# Altium footprint library Molex FFC - FPC Connectors (SMT).PcbLib: 638 footprints (part 2 of 40)
Each footprint in its own frame and in the unit in brackets; x right, y up, seen from the top. Pads: shape width x height; smd on the part's side, far side on the other; paste and mask are expansions set on the pad; w line width, h text height; cw(c..) or ccw(c..) is an arc to the next point about the centre after c.
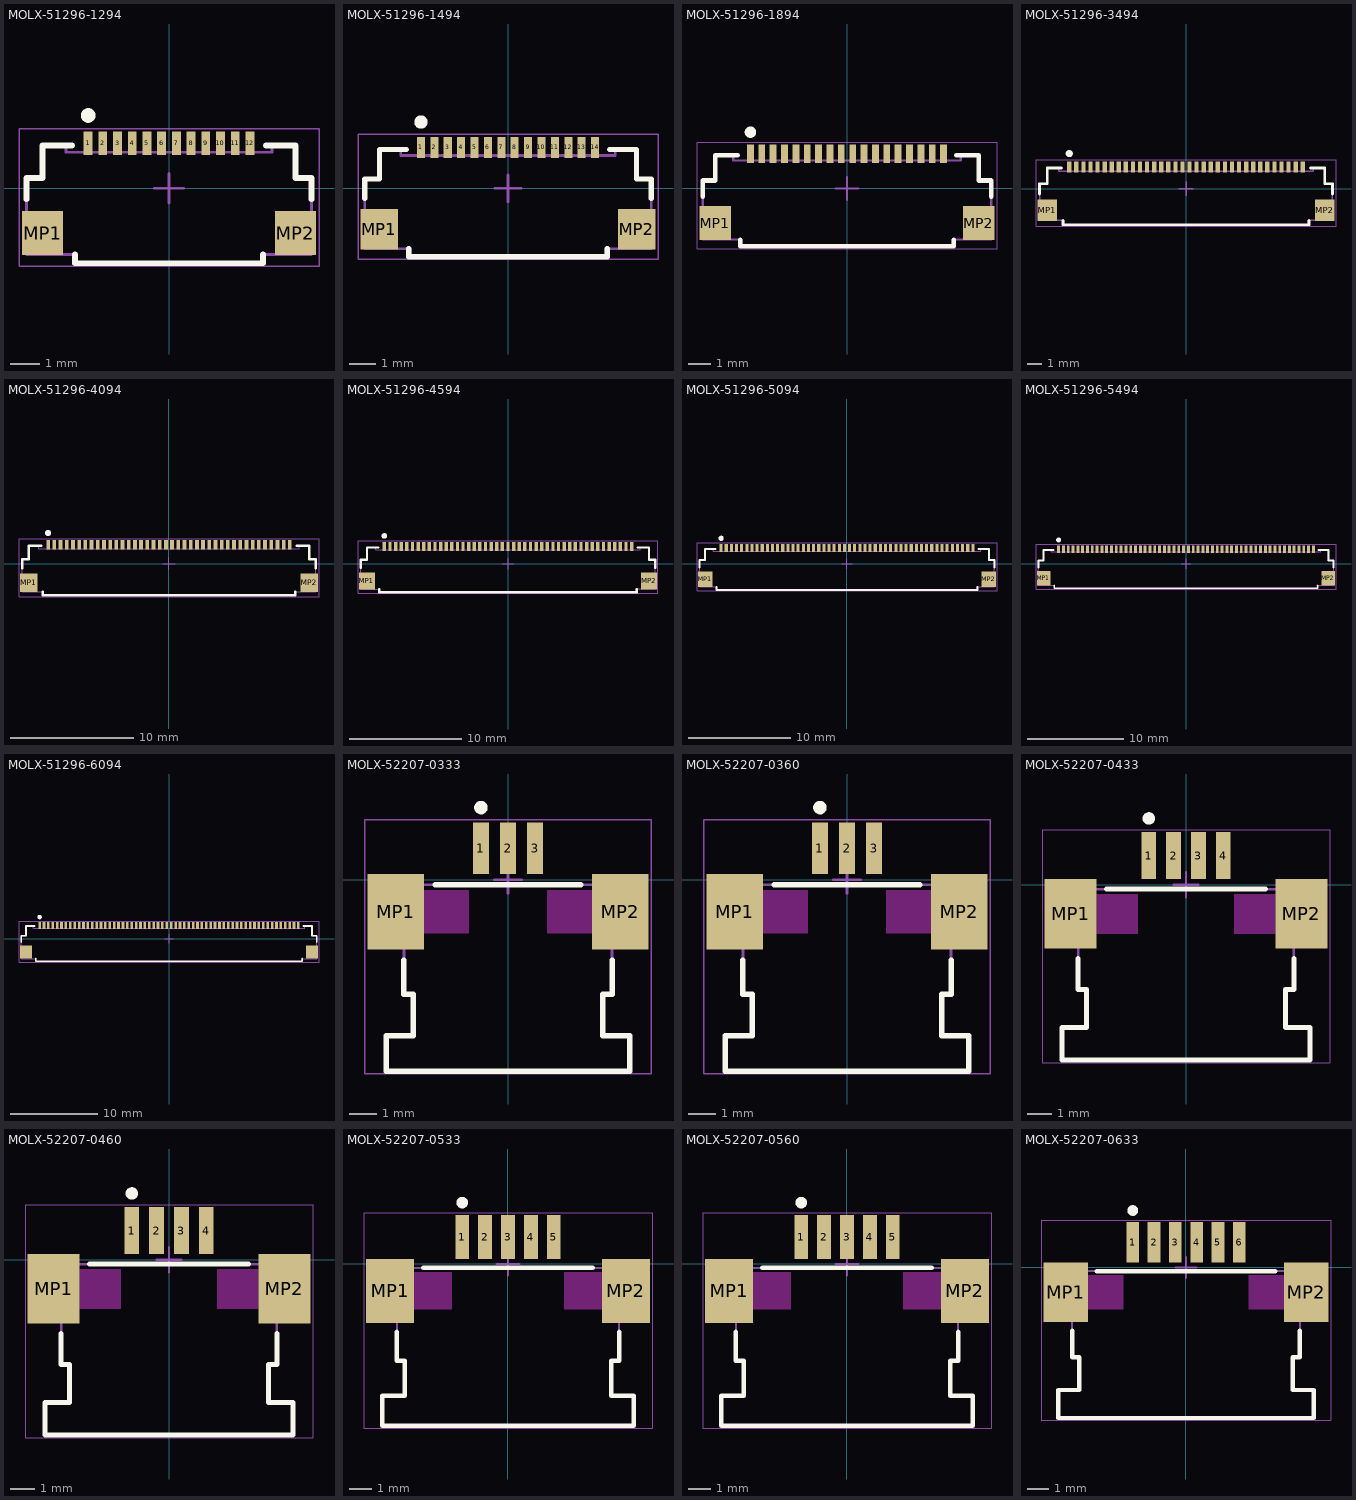
[diagram p1: the footprints below, top view; thin cyan lines are the x and y axes]

## MOLX-51296-1294 [mm] "FPC Connector, 12-Leads, Right Angle, Pitch 0.5 mm, Mated Height 1.3 mm, SMT"
height 1.312
pads (14):
  rect 0.3x0.8 smd: 1(-2.75,1.525) 2(-2.25,1.525) 3(-1.75,1.525) 4(-1.25,1.525) 5(-0.75,1.525) 6(-0.25,1.525) 7(0.25,1.525) 8(0.75,1.525) 9(1.25,1.525) 10(1.75,1.525) 11(2.25,1.525) 12(2.75,1.525)
  rect 1.4x1.5 smd: MP1(-4.3,-1.525) MP2(4.3,-1.525)
Top Overlay:
  circle w0.25: c-2.75,2.475 r0.125
  lines w0.2: -4.85,-0.375 -4.85,0.35 -4.3,0.35 -4.3,1.45 -3.3,1.45 ; -3.2,-2.25 -3.2,-2.55 3.2,-2.55 3.2,-2.25 ; 3.3,1.45 4.3,1.45 4.3,0.35 4.85,0.35 4.85,-0.375
Mechanical 13:
  lines w0.1: -4.85,-2.25 -4.85,0.35 -4.3,0.35 -4.3,1.45 -3.5,1.45 -3.5,1.225 3.5,1.225 3.5,1.45 4.3,1.45 4.3,0.35 4.85,0.35 4.85,-2.25 3.15,-2.25 3.15,-2.55 -3.15,-2.55 -3.15,-2.25 -4.85,-2.25
Mechanical 15:
  lines w0.05: -5.1,-2.65 -5.1,2.025 5.1,2.025 5.1,-2.65 -5.1,-2.65
  lines w0.1: -0.5,0 0.5,0 ; 0,-0.5 0,0.5
3D body: height 0.25, standoff 0, extent -4.85,-2.549 4.85,1.75

## MOLX-51296-1494 [mm] "FPC Connector, 14-Leads, Right Angle, Pitch 0.5 mm, Mated Height 1.3 mm, SMT"
height 1.312
pads (16):
  rect 0.3x0.8 smd: 1(-3.25,1.525) 2(-2.75,1.525) 3(-2.25,1.525) 4(-1.75,1.525) 5(-1.25,1.525) 6(-0.75,1.525) 7(-0.25,1.525) 8(0.25,1.525) 9(0.75,1.525) 10(1.25,1.525) 11(1.75,1.525) 12(2.25,1.525) 13(2.75,1.525) 14(3.25,1.525)
  rect 1.4x1.5 smd: MP1(-4.8,-1.525) MP2(4.8,-1.525)
Top Overlay:
  circle w0.25: c-3.25,2.475 r0.125
  lines w0.2: -5.35,-0.375 -5.35,0.35 -4.8,0.35 -4.8,1.45 -3.8,1.45 ; -3.7,-2.25 -3.7,-2.55 3.7,-2.55 3.7,-2.25 ; 3.8,1.45 4.8,1.45 4.8,0.35 5.35,0.35 5.35,-0.375
Mechanical 13:
  lines w0.1: -5.35,-2.25 -3.65,-2.25 -3.65,-2.55 3.65,-2.55 3.65,-2.25 5.35,-2.25 5.35,0.35 4.8,0.35 4.8,1.45 4,1.45 4,1.225 -4,1.225 -4,1.45 -4.8,1.45 -4.8,0.35 -5.35,0.35 -5.35,-2.25
Mechanical 15:
  lines w0.05: -5.6,-2.65 5.6,-2.65 5.6,2.025 -5.6,2.025 -5.6,-2.65
  lines w0.1: -0.5,0 0.5,0 ; 0,-0.5 0,0.5
3D body: height 0.25, standoff 0, extent -5.35,-2.55 5.35,1.75

## MOLX-51296-1894 [mm] "FPC Connector, 18-Leads, Right Angle, Pitch 0.5 mm, Mated Height 1.3 mm, SMT"
height 1.312
pads (20):
  rect 0.3x0.8 smd: 1(-4.25,1.525) 2(-3.75,1.525) 3(-3.25,1.525) 4(-2.75,1.525) 5(-2.25,1.525) 6(-1.75,1.525) 7(-1.25,1.525) 8(-0.75,1.525) 9(-0.25,1.525) 10(0.25,1.525) 11(0.75,1.525) 12(1.25,1.525) 13(1.75,1.525) 14(2.25,1.525) 15(2.75,1.525) 16(3.25,1.525) 17(3.75,1.525) 18(4.25,1.525)
  rect 1.4x1.5 smd: MP1(-5.8,-1.525) MP2(5.8,-1.525)
Top Overlay:
  circle w0.25: c-4.25,2.475 r0.125
  lines w0.2: -6.35,-0.375 -6.35,0.35 -5.8,0.35 -5.8,1.45 -4.8,1.45 ; -4.7,-2.25 -4.7,-2.55 4.7,-2.55 4.7,-2.25 ; 4.8,1.45 5.8,1.45 5.8,0.35 6.35,0.35 6.35,-0.375
Mechanical 13:
  lines w0.1: -6.35,-2.25 -4.65,-2.25 -4.65,-2.55 4.65,-2.55 4.65,-2.25 6.35,-2.25 6.35,0.35 5.8,0.35 5.8,1.45 5,1.45 5,1.225 -5,1.225 -5,1.45 -5.8,1.45 -5.8,0.35 -6.35,0.35 -6.35,-2.25
Mechanical 15:
  lines w0.05: -6.6,-2.65 6.6,-2.65 6.6,2.025 -6.6,2.025 -6.6,-2.65
  lines w0.1: -0.5,0 0.5,0 ; 0,-0.5 0,0.5
3D body: height 0.25, standoff 0, extent -6.35,-2.549 6.35,1.75

## MOLX-51296-3494 [mm] "FPC Connector, 34-Leads, Right Angle, Pitch 0.5 mm, Mated Height 1.3 mm, SMT"
height 1.312
pads (36):
  rect 0.3x0.8 smd: 1(-8.25,1.525) 2(-7.75,1.525) 3(-7.25,1.525) 4(-6.75,1.525) 5(-6.25,1.525) 6(-5.75,1.525) 7(-5.25,1.525) 8(-4.75,1.525) 9(-4.25,1.525) 10(-3.75,1.525) 11(-3.25,1.525) 12(-2.75,1.525) 13(-2.25,1.525) 14(-1.75,1.525) 15(-1.25,1.525) 16(-0.75,1.525) 17(-0.25,1.525) 18(0.25,1.525) 19(0.75,1.525) 20(1.25,1.525) 21(1.75,1.525) 22(2.25,1.525) 23(2.75,1.525) 24(3.25,1.525) 25(3.75,1.525) 26(4.25,1.525) 27(4.75,1.525) 28(5.25,1.525) 29(5.75,1.525) 30(6.25,1.525) 31(6.75,1.525) 32(7.25,1.525) 33(7.75,1.525) 34(8.25,1.525)
  rect 1.4x1.5 smd: MP1(-9.8,-1.525) MP2(9.8,-1.525)
Top Overlay:
  circle w0.25: c-8.25,2.475 r0.125
  lines w0.2: -10.35,-0.375 -10.35,0.35 -9.8,0.35 -9.8,1.45 -8.8,1.45 ; -8.7,-2.25 -8.7,-2.55 8.7,-2.55 8.7,-2.25 ; 8.8,1.45 9.8,1.45 9.8,0.35 10.35,0.35 10.35,-0.375
Mechanical 13:
  lines w0.1: -10.35,-2.25 -10.35,0.35 -9.8,0.35 -9.8,1.45 -9,1.45 -9,1.225 9,1.225 9,1.45 9.8,1.45 9.8,0.35 10.35,0.35 10.35,-2.25 8.65,-2.25 8.65,-2.55 -8.65,-2.55 -8.65,-2.25 -10.35,-2.25
Mechanical 15:
  lines w0.05: -10.6,-2.65 -10.6,2.025 10.6,2.025 10.6,-2.65 -10.6,-2.65
  lines w0.1: -0.5,0 0.5,0 ; 0,-0.5 0,0.5
3D body: height 0.25, standoff 0, extent -10.35,-2.549 10.35,1.75

## MOLX-51296-4094 [mm] "FPC Connector, 40-Leads, Right Angle, Pitch 0.5 mm, Mated Height 1.3 mm, SMT"
height 1.312
pads (42):
  rect 0.3x0.8 smd: 1(-9.75,1.525) 2(-9.25,1.525) 3(-8.75,1.525) 4(-8.25,1.525) 5(-7.75,1.525) 6(-7.25,1.525) 7(-6.75,1.525) 8(-6.25,1.525) 9(-5.75,1.525) 10(-5.25,1.525) 11(-4.75,1.525) 12(-4.25,1.525) 13(-3.75,1.525) 14(-3.25,1.525) 15(-2.75,1.525) 16(-2.25,1.525) 17(-1.75,1.525) 18(-1.25,1.525) 19(-0.75,1.525) 20(-0.25,1.525) 21(0.25,1.525) 22(0.75,1.525) 23(1.25,1.525) 24(1.75,1.525) 25(2.25,1.525) 26(2.75,1.525) 27(3.25,1.525) 28(3.75,1.525) 29(4.25,1.525) 30(4.75,1.525) 31(5.25,1.525) 32(5.75,1.525) 33(6.25,1.525) 34(6.75,1.525) 35(7.25,1.525) 36(7.75,1.525) 37(8.25,1.525) 38(8.75,1.525) 39(9.25,1.525) 40(9.75,1.525)
  rect 1.4x1.5 smd: MP1(-11.3,-1.525) MP2(11.3,-1.525)
Top Overlay:
  circle w0.25: c-9.75,2.475 r0.125
  lines w0.2: -11.85,-0.375 -11.85,0.35 -11.3,0.35 -11.3,1.45 -10.3,1.45 ; -10.2,-2.25 -10.2,-2.55 10.2,-2.55 10.2,-2.25 ; 10.3,1.45 11.3,1.45 11.3,0.35 11.85,0.35 11.85,-0.375
Mechanical 13:
  lines w0.1: -11.85,-2.25 -11.85,0.35 -11.3,0.35 -11.3,1.45 -10.5,1.45 -10.5,1.225 10.5,1.225 10.5,1.45 11.3,1.45 11.3,0.35 11.85,0.35 11.85,-2.25 10.15,-2.25 10.15,-2.55 -10.15,-2.55 -10.15,-2.25 -11.85,-2.25
Mechanical 15:
  lines w0.05: -12.1,-2.65 -12.1,2.025 12.1,2.025 12.1,-2.65 -12.1,-2.65
  lines w0.1: -0.5,0 0.5,0 ; 0,-0.5 0,0.5
3D body: height 0.25, standoff 0, extent -11.85,-2.549 11.85,1.75

## MOLX-51296-4594 [mm] "FPC Connector, 45-Leads, Right Angle, Pitch 0.5 mm, Mated Height 1.3 mm, SMT"
height 1.312
pads (47):
  rect 0.3x0.8 smd: 1(-11,1.525) 2(-10.5,1.525) 3(-10,1.525) 4(-9.5,1.525) 5(-9,1.525) 6(-8.5,1.525) 7(-8,1.525) 8(-7.5,1.525) 9(-7,1.525) 10(-6.5,1.525) 11(-6,1.525) 12(-5.5,1.525) 13(-5,1.525) 14(-4.5,1.525) 15(-4,1.525) 16(-3.5,1.525) 17(-3,1.525) 18(-2.5,1.525) 19(-2,1.525) 20(-1.5,1.525) 21(-1,1.525) 22(-0.5,1.525) 23(0,1.525) 24(0.5,1.525) 25(1,1.525) 26(1.5,1.525) 27(2,1.525) 28(2.5,1.525) 29(3,1.525) 30(3.5,1.525) 31(4,1.525) 32(4.5,1.525) 33(5,1.525) 34(5.5,1.525) 35(6,1.525) 36(6.5,1.525) 37(7,1.525) 38(7.5,1.525) 39(8,1.525) 40(8.5,1.525) 41(9,1.525) 42(9.5,1.525) 43(10,1.525) 44(10.5,1.525) 45(11,1.525)
  rect 1.4x1.5 smd: MP1(-12.55,-1.525) MP2(12.55,-1.525)
Top Overlay:
  circle w0.25: c-11,2.475 r0.125
  lines w0.2: -13.1,-0.375 -13.1,0.35 -12.55,0.35 -12.55,1.45 -11.55,1.45 ; -11.45,-2.25 -11.45,-2.55 11.45,-2.55 11.45,-2.25 ; 11.55,1.45 12.55,1.45 12.55,0.35 13.1,0.35 13.1,-0.375
Mechanical 13:
  lines w0.1: -13.1,-2.25 -11.4,-2.25 -11.4,-2.55 11.4,-2.55 11.4,-2.25 13.1,-2.25 13.1,0.35 12.55,0.35 12.55,1.45 11.75,1.45 11.75,1.225 -11.75,1.225 -11.75,1.45 -12.55,1.45 -12.55,0.35 -13.1,0.35 -13.1,-2.25
Mechanical 15:
  lines w0.05: -13.35,-2.65 13.35,-2.65 13.35,2.025 -13.35,2.025 -13.35,-2.65
  lines w0.1: -0.5,0 0.5,0 ; 0,-0.5 0,0.5
3D body: height 0.25, standoff 0, extent -13.1,-2.549 13.1,1.75

## MOLX-51296-5094 [mm] "FPC Connector, 50-Leads, Right Angle, Pitch 0.5 mm, Mated Height 1.3 mm, SMT"
height 1.312
pads (52):
  rect 0.3x0.8 smd: 1(-12.25,1.525) 2(-11.75,1.525) 3(-11.25,1.525) 4(-10.75,1.525) 5(-10.25,1.525) 6(-9.75,1.525) 7(-9.25,1.525) 8(-8.75,1.525) 9(-8.25,1.525) 10(-7.75,1.525) 11(-7.25,1.525) 12(-6.75,1.525) 13(-6.25,1.525) 14(-5.75,1.525) 15(-5.25,1.525) 16(-4.75,1.525) 17(-4.25,1.525) 18(-3.75,1.525) 19(-3.25,1.525) 20(-2.75,1.525) 21(-2.25,1.525) 22(-1.75,1.525) 23(-1.25,1.525) 24(-0.75,1.525) 25(-0.25,1.525) 26(0.25,1.525) 27(0.75,1.525) 28(1.25,1.525) 29(1.75,1.525) 30(2.25,1.525) 31(2.75,1.525) 32(3.25,1.525) 33(3.75,1.525) 34(4.25,1.525) 35(4.75,1.525) 36(5.25,1.525) 37(5.75,1.525) 38(6.25,1.525) 39(6.75,1.525) 40(7.25,1.525) 41(7.75,1.525) 42(8.25,1.525) 43(8.75,1.525) 44(9.25,1.525) 45(9.75,1.525) 46(10.25,1.525) 47(10.75,1.525) 48(11.25,1.525) 49(11.75,1.525) 50(12.25,1.525)
  rect 1.4x1.5 smd: MP1(-13.8,-1.525) MP2(13.8,-1.525)
Top Overlay:
  circle w0.25: c-12.25,2.475 r0.125
  lines w0.2: -14.35,-0.375 -14.35,0.35 -13.8,0.35 -13.8,1.45 -12.8,1.45 ; -12.7,-2.25 -12.7,-2.55 12.7,-2.55 12.7,-2.25 ; 12.8,1.45 13.8,1.45 13.8,0.35 14.35,0.35 14.35,-0.375
Mechanical 13:
  lines w0.1: -14.35,-2.25 -12.65,-2.25 -12.65,-2.55 12.65,-2.55 12.65,-2.25 14.35,-2.25 14.35,0.35 13.8,0.35 13.8,1.45 13,1.45 13,1.225 -13,1.225 -13,1.45 -13.8,1.45 -13.8,0.35 -14.35,0.35 -14.35,-2.25
Mechanical 15:
  lines w0.05: -14.6,-2.65 14.6,-2.65 14.6,2.025 -14.6,2.025 -14.6,-2.65
  lines w0.1: -0.5,0 0.5,0 ; 0,-0.5 0,0.5
3D body: height 0.25, standoff 0, extent -14.35,-2.549 14.35,1.75

## MOLX-51296-5494 [mm] "FPC Connector, 54-Leads, Right Angle, Pitch 0.5 mm, Mated Height 1.3 mm, SMT"
height 1.312
pads (56):
  rect 0.3x0.8 smd: 1(-13.25,1.525) 2(-12.75,1.525) 3(-12.25,1.525) 4(-11.75,1.525) 5(-11.25,1.525) 6(-10.75,1.525) 7(-10.25,1.525) 8(-9.75,1.525) 9(-9.25,1.525) 10(-8.75,1.525) 11(-8.25,1.525) 12(-7.75,1.525) 13(-7.25,1.525) 14(-6.75,1.525) 15(-6.25,1.525) 16(-5.75,1.525) 17(-5.25,1.525) 18(-4.75,1.525) 19(-4.25,1.525) 20(-3.75,1.525) 21(-3.25,1.525) 22(-2.75,1.525) 23(-2.25,1.525) 24(-1.75,1.525) 25(-1.25,1.525) 26(-0.75,1.525) 27(-0.25,1.525) 28(0.25,1.525) 29(0.75,1.525) 30(1.25,1.525) 31(1.75,1.525) 32(2.25,1.525) 33(2.75,1.525) 34(3.25,1.525) 35(3.75,1.525) 36(4.25,1.525) 37(4.75,1.525) 38(5.25,1.525) 39(5.75,1.525) 40(6.25,1.525) 41(6.75,1.525) 42(7.25,1.525) 43(7.75,1.525) 44(8.25,1.525) 45(8.75,1.525) 46(9.25,1.525) 47(9.75,1.525) 48(10.25,1.525) 49(10.75,1.525) 50(11.25,1.525) 51(11.75,1.525) 52(12.25,1.525) 53(12.75,1.525) 54(13.25,1.525)
  rect 1.4x1.5 smd: MP1(-14.8,-1.525) MP2(14.8,-1.525)
Top Overlay:
  circle w0.25: c-13.25,2.475 r0.125
  lines w0.2: -15.35,-0.375 -15.35,0.35 -14.8,0.35 -14.8,1.45 -13.8,1.45 ; -13.7,-2.25 -13.7,-2.55 13.7,-2.55 13.7,-2.25 ; 13.8,1.45 14.8,1.45 14.8,0.35 15.35,0.35 15.35,-0.375
Mechanical 13:
  lines w0.1: -15.35,-2.25 -15.35,0.35 -14.8,0.35 -14.8,1.45 -14,1.45 -14,1.225 14,1.225 14,1.45 14.8,1.45 14.8,0.35 15.35,0.35 15.35,-2.25 13.65,-2.25 13.65,-2.55 -13.65,-2.55 -13.65,-2.25 -15.35,-2.25
Mechanical 15:
  lines w0.05: -15.6,-2.65 -15.6,2.025 15.6,2.025 15.6,-2.65 -15.6,-2.65
  lines w0.1: -0.5,0 0.5,0 ; 0,-0.5 0,0.5
3D body: height 0.25, standoff 0, extent -15.35,-2.549 15.35,1.75

## MOLX-51296-6094 [mm] "FPC Connector, 60-Leads, Right Angle, Pitch 0.5 mm, Mated Height 1.3 mm, SMT"
height 1.312
pads (62):
  rect 0.3x0.8 smd: 1(-14.75,1.525) 2(-14.25,1.525) 3(-13.75,1.525) 4(-13.25,1.525) 5(-12.75,1.525) 6(-12.25,1.525) 7(-11.75,1.525) 8(-11.25,1.525) 9(-10.75,1.525) 10(-10.25,1.525) 11(-9.75,1.525) 12(-9.25,1.525) 13(-8.75,1.525) 14(-8.25,1.525) 15(-7.75,1.525) 16(-7.25,1.525) 17(-6.75,1.525) 18(-6.25,1.525) 19(-5.75,1.525) 20(-5.25,1.525) 21(-4.75,1.525) 22(-4.25,1.525) 23(-3.75,1.525) 24(-3.25,1.525) 25(-2.75,1.525) 26(-2.25,1.525) 27(-1.75,1.525) 28(-1.25,1.525) 29(-0.75,1.525) 30(-0.25,1.525) 31(0.25,1.525) 32(0.75,1.525) 33(1.25,1.525) 34(1.75,1.525) 35(2.25,1.525) 36(2.75,1.525) 37(3.25,1.525) 38(3.75,1.525) 39(4.25,1.525) 40(4.75,1.525) 41(5.25,1.525) 42(5.75,1.525) 43(6.25,1.525) 44(6.75,1.525) 45(7.25,1.525) 46(7.75,1.525) 47(8.25,1.525) 48(8.75,1.525) 49(9.25,1.525) 50(9.75,1.525) 51(10.25,1.525) 52(10.75,1.525) 53(11.25,1.525) 54(11.75,1.525) 55(12.25,1.525) 56(12.75,1.525) 57(13.25,1.525) 58(13.75,1.525) 59(14.25,1.525) 60(14.75,1.525)
  rect 1.4x1.5 smd: MP1(-16.3,-1.525) MP2(16.3,-1.525)
Top Overlay:
  circle w0.25: c-14.75,2.475 r0.125
  lines w0.2: -16.85,-0.375 -16.85,0.35 -16.3,0.35 -16.3,1.45 -15.3,1.45 ; -15.2,-2.25 -15.2,-2.55 15.2,-2.55 15.2,-2.25 ; 15.3,1.45 16.3,1.45 16.3,0.35 16.85,0.35 16.85,-0.375
Mechanical 13:
  lines w0.1: -16.85,-2.25 -15.15,-2.25 -15.15,-2.55 15.15,-2.55 15.15,-2.25 16.85,-2.25 16.85,0.35 16.3,0.35 16.3,1.45 15.5,1.45 15.5,1.225 -15.5,1.225 -15.5,1.45 -16.3,1.45 -16.3,0.35 -16.85,0.35 -16.85,-2.25
Mechanical 15:
  lines w0.05: -17.1,-2.65 17.1,-2.65 17.1,2.025 -17.1,2.025 -17.1,-2.65
  lines w0.1: -0.5,0 0.5,0 ; 0,-0.5 0,0.5
3D body: height 0.25, standoff 0, extent -16.85,-2.549 16.85,1.75

## MOLX-52207-0333 [mm] "FPC Connector, 3-Leads, Right Angle, Pitch 1.0 mm, Mated Height 2.7 mm, SMT"
height 2.712
pads (5):
  rect 0.6x1.9 smd: 1(-1,1.175) 2(0,1.175) 3(1,1.175)
  rect 2.1x2.8 smd: MP1(-4.15,-1.175) MP2(4.15,-1.175)
Top Overlay:
  circle w0.25: c-1,2.675 r0.125
  lines w0.2: -3.85,-2.975 -3.85,-4.225 ; -2.7,-0.175 2.7,-0.175 ; 3.85,-2.975 3.85,-4.225 ; -3.85,-4.225 -3.513,-4.225 ; -3.85,-4.225 -3.85,-4.225 ; -3.512,-4.225 -3.512,-5.765 -4.5,-5.765 -4.5,-7.075 4.5,-7.075 4.5,-5.765 3.512,-5.765 3.512,-4.225 ; -3.513,-4.225 -3.512,-4.225 ; 3.513,-4.225 3.85,-4.225 ; 3.512,-4.225 3.513,-4.225 ; 3.85,-4.225 3.85,-4.225
Keep-Out Layer:
  region: -3.1,-0.375 -1.45,-0.375 -1.45,-1.975 -3.1,-1.975
  region: 3.1,-0.375 1.45,-0.375 1.45,-1.975 3.1,-1.975
Mechanical 13:
  lines w0.1: -3.85,-2.175 -4.65,-2.175 -4.65,-0.175 4.65,-0.175 4.65,-2.175 3.85,-2.175 ; -3.85,-2.175 -3.85,-4.225 -3.512,-4.225 -3.512,-5.765 -4.5,-5.765 -4.5,-7.075 4.5,-7.075 4.5,-5.765 3.512,-5.765 3.512,-4.225 3.85,-4.225 3.85,-2.175
Mechanical 15:
  lines w0.05: -5.3,-7.175 -5.3,2.225 5.3,2.225 5.3,-7.175 -5.3,-7.175
  lines w0.1: -0.5,0 0.5,0 ; 0,-0.5 0,0.5
3D body: height 0.25, standoff 0, extent -4.65,-7.075 4.65,1.825

## MOLX-52207-0360 [mm] "FPC Connector, 3-Leads, Right Angle, Pitch 1.0 mm, Mated Height 2.7 mm, SMT"
height 2.712
pads (5):
  rect 0.6x1.9 smd: 1(-1,1.175) 2(0,1.175) 3(1,1.175)
  rect 2.1x2.8 smd: MP1(-4.15,-1.175) MP2(4.15,-1.175)
Top Overlay:
  circle w0.25: c-1,2.675 r0.125
  lines w0.2: -3.85,-2.975 -3.85,-4.225 -3.513,-4.225 -3.512,-5.765 -4.5,-5.765 -4.5,-7.075 4.5,-7.075 4.5,-5.765 3.512,-5.765 3.512,-4.225 3.85,-4.225 3.85,-2.975 ; -2.7,-0.175 2.7,-0.175
Keep-Out Layer:
  region: 3.1,-0.375 1.45,-0.375 1.45,-1.975 3.1,-1.975
  region: -3.1,-0.375 -1.45,-0.375 -1.45,-1.975 -3.1,-1.975
Mechanical 13:
  lines w0.1: -3.85,-2.175 -4.65,-2.175 -4.65,-0.175 4.65,-0.175 4.65,-2.175 3.85,-2.175 ; -3.85,-2.175 -3.85,-4.225 -3.512,-4.225 -3.512,-5.765 -4.5,-5.765 -4.5,-7.075 4.5,-7.075 4.5,-5.765 3.512,-5.765 3.512,-4.225 3.85,-4.225 3.85,-2.175
Mechanical 15:
  lines w0.05: -5.3,-7.175 5.3,-7.175 5.3,2.225 -5.3,2.225 -5.3,-7.175
  lines w0.1: -0.5,0 0.5,0 ; 0,-0.5 0,0.5
3D body: height 0.25, standoff 0, extent -4.65,-7.075 4.65,1.825

## MOLX-52207-0433 [mm] "FPC Connector, 4-Leads, Right Angle, Pitch 1.0 mm, Mated Height 2.7 mm, SMT"
height 2.712
pads (6):
  rect 0.6x1.9 smd: 1(-1.5,1.175) 2(-0.5,1.175) 3(0.5,1.175) 4(1.5,1.175)
  rect 2.1x2.8 smd: MP1(-4.65,-1.175) MP2(4.65,-1.175)
Top Overlay:
  circle w0.25: c-1.5,2.675 r0.125
  lines w0.2: -4.35,-2.975 -4.35,-4.225 ; -3.2,-0.175 3.2,-0.175 ; 4.35,-2.975 4.35,-4.225 ; -4.35,-4.225 -4.013,-4.225 -4.012,-4.225 -4.012,-5.765 -5,-5.765 -5,-7.075 5,-7.075 5,-5.765 4.012,-5.765 4.012,-4.225 4.013,-4.225 4.35,-4.225 ; -4.35,-4.225 -4.35,-4.225 ; 4.35,-4.225 4.35,-4.225
Keep-Out Layer:
  region: -3.6,-0.375 -1.95,-0.375 -1.95,-1.975 -3.6,-1.975
  region: 3.6,-0.375 1.95,-0.375 1.95,-1.975 3.6,-1.975
Mechanical 13:
  lines w0.1: -5.15,-2.175 -5.15,-0.175 5.15,-0.175 5.15,-2.175 4.35,-2.175 4.35,-4.225 4.012,-4.225 4.012,-5.765 5,-5.765 5,-7.075 -5,-7.075 -5,-5.765 -4.012,-5.765 -4.012,-4.225 -4.35,-4.225 -4.35,-2.175 -5.15,-2.175
Mechanical 15:
  lines w0.05: -5.8,-7.175 -5.8,2.225 5.8,2.225 5.8,-7.175 -5.8,-7.175
  lines w0.1: -0.5,0 0.5,0 ; 0,-0.5 0,0.5
3D body: height 0.25, standoff 0, extent -5.15,-7.075 5.15,1.825

## MOLX-52207-0460 [mm] "FPC Connector, 4-Leads, Right Angle, Pitch 1.0 mm, Mated Height 2.7 mm, SMT"
height 2.712
pads (6):
  rect 0.6x1.9 smd: 1(-1.5,1.175) 2(-0.5,1.175) 3(0.5,1.175) 4(1.5,1.175)
  rect 2.1x2.8 smd: MP1(-4.65,-1.175) MP2(4.65,-1.175)
Top Overlay:
  circle w0.25: c-1.5,2.675 r0.125
  lines w0.2: -4.35,-2.975 -4.35,-4.225 -4.013,-4.225 ; -4.012,-4.225 -4.012,-5.765 -5,-5.765 -5,-7.075 5,-7.075 5,-5.765 4.012,-5.765 4.012,-4.225 ; -3.2,-0.175 3.2,-0.175 ; 4.013,-4.225 4.35,-4.225 4.35,-2.975
Keep-Out Layer:
  region: 3.6,-0.375 1.95,-0.375 1.95,-1.975 3.6,-1.975
  region: -3.6,-0.375 -1.95,-0.375 -1.95,-1.975 -3.6,-1.975
Mechanical 13:
  lines w0.1: -5.15,-2.175 -4.35,-2.175 -4.35,-4.225 -4.012,-4.225 -4.012,-5.765 -5,-5.765 -5,-7.075 5,-7.075 5,-5.765 4.012,-5.765 4.012,-4.225 4.35,-4.225 4.35,-2.175 5.15,-2.175 5.15,-0.175 -5.15,-0.175 -5.15,-2.175
Mechanical 15:
  lines w0.05: -5.8,-7.175 5.8,-7.175 5.8,2.225 -5.8,2.225 -5.8,-7.175
  lines w0.1: -0.5,0 0.5,0 ; 0,-0.5 0,0.5
3D body: height 0.25, standoff 0, extent -5.15,-7.075 5.15,1.825

## MOLX-52207-0533 [mm] "FPC Connector, 5-Leads, Right Angle, Pitch 1.0 mm, Mated Height 2.7 mm, SMT"
height 2.712
pads (7):
  rect 0.6x1.9 smd: 1(-2,1.175) 2(-1,1.175) 3(0,1.175) 4(1,1.175) 5(2,1.175)
  rect 2.1x2.8 smd: MP1(-5.15,-1.175) MP2(5.15,-1.175)
Top Overlay:
  circle w0.25: c-2,2.675 r0.125
  lines w0.2: -4.85,-2.975 -4.85,-4.225 -4.513,-4.225 -4.512,-5.765 -5.5,-5.765 -5.5,-7.075 5.5,-7.075 5.5,-5.765 4.512,-5.765 4.512,-4.225 4.85,-4.225 4.85,-2.975 ; -3.7,-0.175 3.7,-0.175
Keep-Out Layer:
  region: -4.1,-0.375 -2.45,-0.375 -2.45,-1.975 -4.1,-1.975
  region: 4.1,-0.375 2.45,-0.375 2.45,-1.975 4.1,-1.975
Mechanical 13:
  lines w0.1: -5.65,-2.175 -5.65,-0.175 5.65,-0.175 5.65,-2.175 4.85,-2.175 4.85,-4.225 4.513,-4.225 4.512,-5.765 5.5,-5.765 5.5,-7.075 -5.5,-7.075 -5.5,-5.765 -4.512,-5.765 -4.512,-4.225 -4.85,-4.225 -4.85,-2.175 -5.65,-2.175
Mechanical 15:
  lines w0.05: -6.3,-7.175 -6.3,2.225 6.3,2.225 6.3,-7.175 -6.3,-7.175
  lines w0.1: -0.5,0 0.5,0 ; 0,-0.5 0,0.5
3D body: height 0.25, standoff 0, extent -5.65,-7.075 5.65,1.825

## MOLX-52207-0560 [mm] "FPC Connector, 5-Leads, Right Angle, Pitch 1.0 mm, Mated Height 2.7 mm, SMT"
height 2.712
pads (7):
  rect 0.6x1.9 smd: 1(-2,1.175) 2(-1,1.175) 3(0,1.175) 4(1,1.175) 5(2,1.175)
  rect 2.1x2.8 smd: MP1(-5.15,-1.175) MP2(5.15,-1.175)
Top Overlay:
  circle w0.25: c-2,2.675 r0.125
  lines w0.2: -4.85,-2.975 -4.85,-4.225 -4.513,-4.225 -4.512,-5.765 -5.5,-5.765 -5.5,-7.075 5.5,-7.075 5.5,-5.765 4.512,-5.765 4.512,-4.225 4.85,-4.225 4.85,-2.975 ; -3.7,-0.175 3.7,-0.175
Keep-Out Layer:
  region: 4.1,-0.375 2.45,-0.375 2.45,-1.975 4.1,-1.975
  region: -4.1,-0.375 -2.45,-0.375 -2.45,-1.975 -4.1,-1.975
Mechanical 13:
  lines w0.1: -5.65,-2.175 -4.85,-2.175 -4.85,-4.225 -4.512,-4.225 -4.512,-5.765 -5.5,-5.765 -5.5,-7.075 5.5,-7.075 5.5,-5.765 4.512,-5.765 4.512,-4.225 4.85,-4.225 4.85,-2.175 5.65,-2.175 5.65,-0.175 -5.65,-0.175 -5.65,-2.175
Mechanical 15:
  lines w0.05: -6.3,-7.175 6.3,-7.175 6.3,2.225 -6.3,2.225 -6.3,-7.175
  lines w0.1: -0.5,0 0.5,0 ; 0,-0.5 0,0.5
3D body: height 0.25, standoff 0, extent -5.65,-7.075 5.65,1.825

## MOLX-52207-0633 [mm] "FPC Connector, 6-Leads, Right Angle, Pitch 1.0 mm, Mated Height 2.7 mm, SMT"
height 2.712
pads (8):
  rect 0.6x1.9 smd: 1(-2.5,1.175) 2(-1.5,1.175) 3(-0.5,1.175) 4(0.5,1.175) 5(1.5,1.175) 6(2.5,1.175)
  rect 2.1x2.8 smd: MP1(-5.65,-1.175) MP2(5.65,-1.175)
Top Overlay:
  circle w0.25: c-2.5,2.675 r0.125
  lines w0.2: -5.35,-2.975 -5.35,-4.225 -5.013,-4.225 -5.012,-5.765 -6,-5.765 -6,-7.075 6,-7.075 6,-5.765 5.012,-5.765 5.012,-4.225 5.35,-4.225 5.35,-2.975 ; -4.2,-0.175 4.2,-0.175
Keep-Out Layer:
  region: -4.6,-0.375 -2.95,-0.375 -2.95,-1.975 -4.6,-1.975
  region: 4.6,-0.375 2.95,-0.375 2.95,-1.975 4.6,-1.975
Mechanical 13:
  lines w0.1: -6.15,-2.175 -6.15,-0.175 6.15,-0.175 6.15,-2.175 5.35,-2.175 5.35,-4.225 5.013,-4.225 5.012,-5.765 6,-5.765 6,-7.075 -6,-7.075 -6,-5.765 -5.012,-5.765 -5.012,-4.225 -5.35,-4.225 -5.35,-2.175 -6.15,-2.175
Mechanical 15:
  lines w0.05: -6.8,-7.175 -6.8,2.225 6.8,2.225 6.8,-7.175 -6.8,-7.175
  lines w0.1: -0.5,0 0.5,0 ; 0,-0.5 0,0.5
3D body: height 0.25, standoff 0, extent -6.15,-7.075 6.15,1.825